# Altium footprint library Component.PcbLib: 115 footprints (part 3 of 8)
Each footprint in its own frame and in the unit in brackets; x right, y up, seen from the top. Pads: shape width x height; smd on the part's side, far side on the other; paste and mask are expansions set on the pad; w line width, h text height; cw(c..) or ccw(c..) is an arc to the next point about the centre after c.
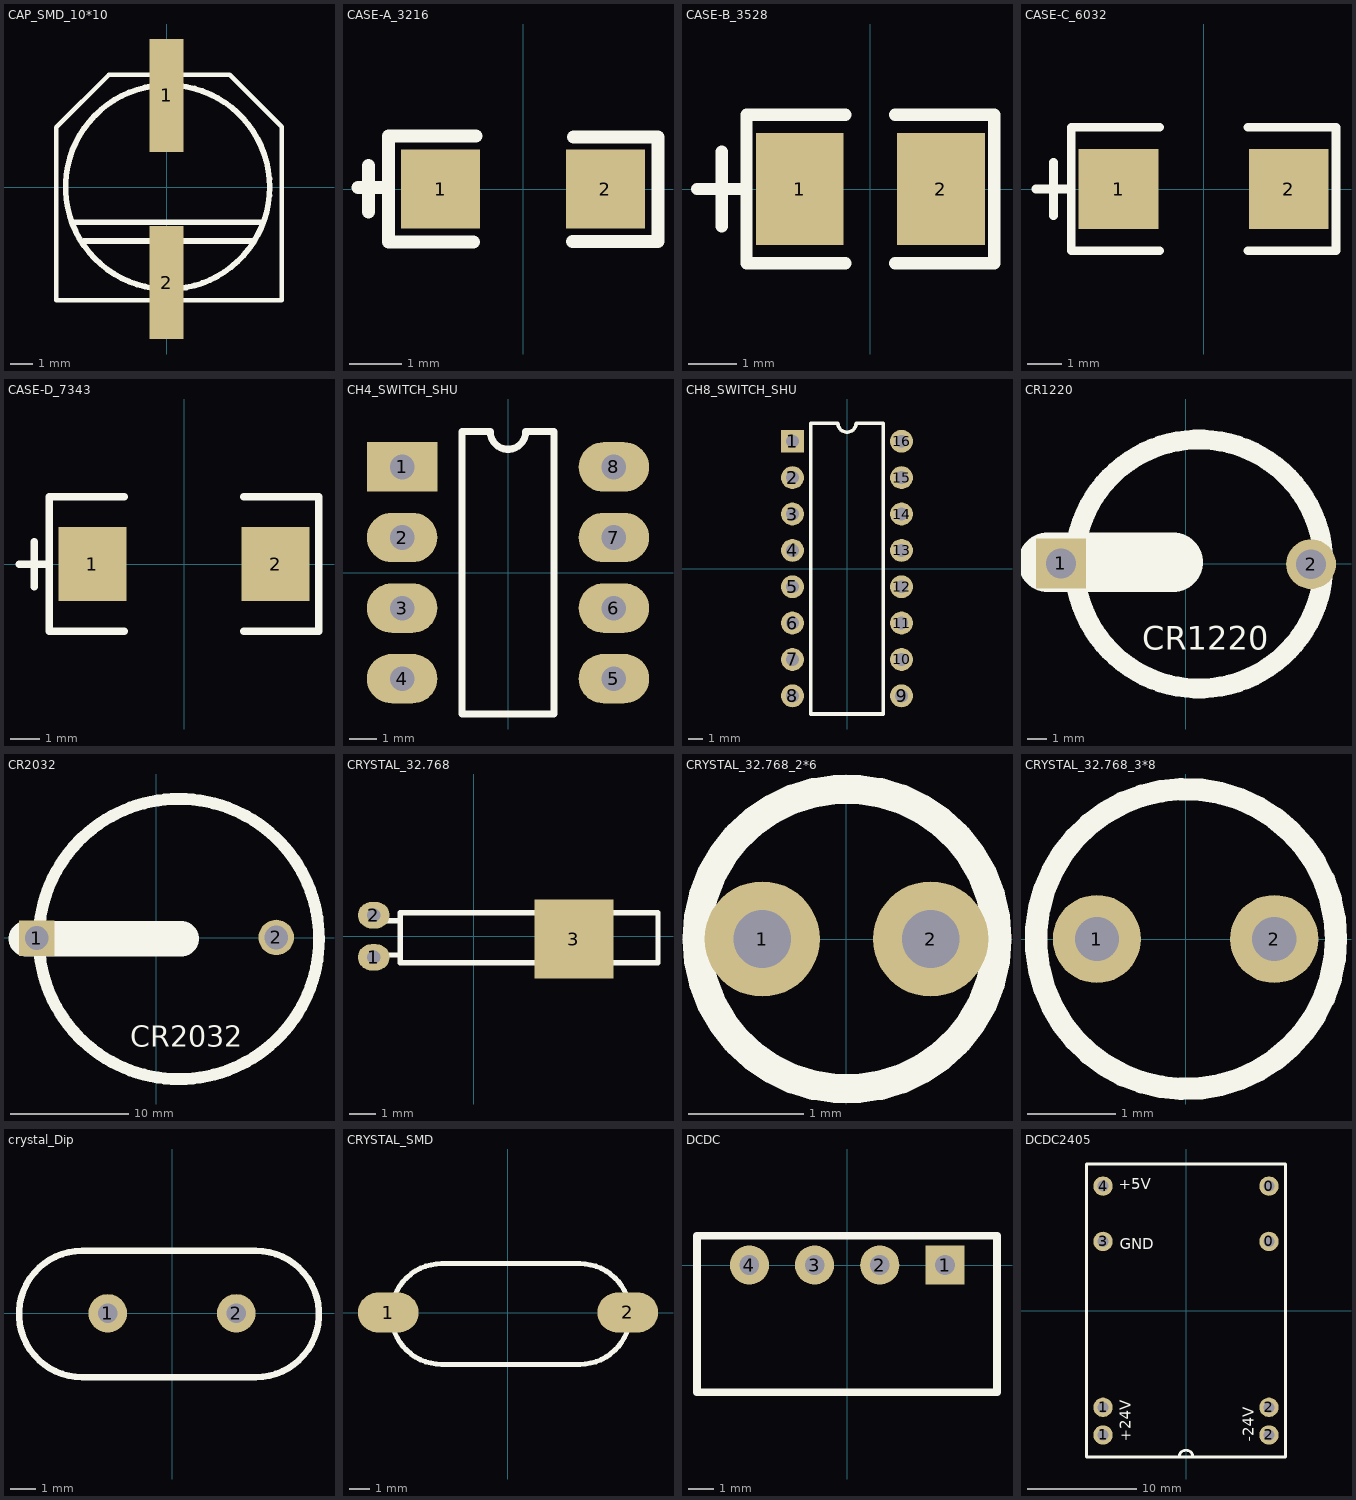
[diagram p2: the footprints below, top view; thin cyan lines are the x and y axes]

## CAP_SMD_10*10 [mm] "贴片电解电容"
pads (2):
  rect 1.5x5 smd: 1(-0.01,4.06) 2(-0.01,-4.23)
Top Overlay:
  circle w0.254: c0.04,0 r4.522
  lines w0.2: -4.89,-5.005 5.09,-5.005 5.09,2.675 2.79,4.975 -2.56,4.975 -4.89,2.645 -4.89,-5.005
  lines w0.254: -4.21,-1.56 4.22,-1.56 ; -3.66,-2.39 3.74,-2.39
3D body: height 10.61, standoff -0.01, extent -5.187,-5.682 5.113,5.618

## CASE-A_3216 [mil]
pads (2):
  rect 60x60 smd: 1(-62.5,0) 2(62.5,0)
Top Overlay:
  lines w9.84: -37.7,-40.16 -101.87,-40.16 -101.87,40.16 -35.73,40.16 ; 37.34,-39.76 102.3,-39.76 102.3,39.37 38.13,39.37
  lines w10: -125.1,1.18 -101.87,1.18 ; -117.22,-17.32 -117.22,17.72
3D body: height 62.99, standoff 0, extent -71.95,-32.29 77.66,30.71

## CASE-B_3528 [mm]
pads (2):
  rect 1.8x2.3 smd: 1(-1.45,0) 2(1.45,0)
Top Overlay:
  lines w0.254: -3.556,0 -2.54,0 ; -3.048,-0.762 -3.048,0.762 ; -0.508,-1.524 -2.54,-1.524 -2.54,1.524 -0.508,1.524 ; 0.508,-1.524 2.54,-1.524 2.54,1.524 0.508,1.524
3D body: height 1.91, standoff 0, extent -1.746,-1.4 1.746,1.4

## CASE-C_6032 [mm]
pads (2):
  rect 2.3x2.3 smd: 1(-2.45,0) 2(2.45,0)
Top Overlay:
  lines w0.254: -4.826,0 -3.81,0 ; -4.318,-0.762 -4.318,0.762 ; -1.27,-1.778 -3.81,-1.778 -3.81,1.778 -1.27,1.778 ; 1.27,-1.778 3.81,-1.778 3.81,1.778 1.27,1.778
3D body: height 2.51, standoff 0, extent -2.997,-1.6 2.997,1.6

## CASE-D_7343 [mm]
pads (2):
  rect 2.3x2.5 smd: 1(-3.1,0) 2(3.1,0)
Top Overlay:
  lines w0.254: -5.588,0 -4.572,0 ; -5.08,-0.762 -5.08,0.762 ; -2.032,-2.286 -4.572,-2.286 -4.572,2.286 -2.032,2.286 ; 2.032,-2.286 4.572,-2.286 4.572,2.286 2.032,2.286
3D body: height 2.81, standoff 0, extent -3.647,-2.15 3.647,2.15

## CH4_SWITCH_SHU [mil]
pads (8):
  rect 100x70 hole 35: 1(-150,150)
  oval 100x70 hole 35: 2(-150,50) 3(-150,-50) 4(-150,-150) 5(150,-150) 6(150,-50) 7(150,50) 8(150,150)
Top Overlay:
  lines w10: -65,-200 -65,200 -25,200 ccw(c0,200) 25,200 65,200 65,-200 -65,-200
3D body: height 448.82, standoff -78.74, extent -275.2,-234.25 220.87,227.16

## CH8_SWITCH_SHU [mm]
height 1.99
pads (16):
  rect 1.6x1.6 hole 0.9: 1(-3.81,8.89)
  round 1.6 hole 0.9: 2(-3.81,6.35) 3(-3.81,3.81) 4(-3.81,1.27) 5(-3.81,-1.27) 6(-3.81,-3.81) 7(-3.81,-6.35) 8(-3.81,-8.89) 9(3.81,-8.89) 10(3.81,-6.35) 11(3.81,-3.81) 12(3.81,-1.27) 13(3.81,1.27) 14(3.81,3.81) 15(3.81,6.35) 16(3.81,8.89)
Top Overlay:
  lines w0.254: -2.54,-10.16 -2.54,10.16 -0.635,10.16 ccw(c0,10.16) 0.635,10.16 2.54,10.16 2.54,-10.16 -2.54,-10.16
3D body: height 11.4, standoff -2, extent -7.31,-10.96 5.29,10.92

## CR1220 [mm] "pin 12mm"
height 2
pads (2):
  rect 2.5x2.5 hole 1.5: 1(-6.285,0.02)
  round 2.5 hole 1.5: 2(6.285,-0.02)
Top Overlay:
  circle w1: c0.654,-0.01 r6.25
  lines w3: -6.955,0.08 -0.635,0.08
  text "CR1220" at -2.205,-4.73 h2
3D body: height 4.2, standoff -3.7, extent -6.445,-6.09 7.255,6.41

## CR2032 [mm] "pin 20mm"
height 3.2
pads (2):
  rect 3x3 hole 2: 1(-10.14,-0.025)
  round 3 hole 2: 2(10.14,0.025)
Top Overlay:
  circle w1: c1.899,-0.105 r11.861
  lines w3: -11.04,-0.075 2.11,-0.075
  text "CR2032" at -2.21,-9.825 h3
3D body: height 4.64, standoff -4.6, extent -13.354,-14.363 15.094,14.085

## CRYSTAL_32.768 [mm]
height 1.99
pads (3):
  oval 1.2x1 hole 0.5: 1(-3.805,-0.8) 2(-3.805,0.8)
  rect 3x3 smd: 3(3.805,-0.109)
Top Overlay:
  lines w0.2: -3.495,-0.709 -2.795,-0.709 ; -3.395,0.591 -2.795,0.591 ; -2.595,-1.009 7.005,-1.009 7.005,0.891 -2.795,0.891 -2.795,-1.009 -2.495,-1.009
3D body: height 1.55, standoff -1.55, extent -4.46,-1.629 6.69,1.471

## CRYSTAL_32.768_2*6 [mm] "φ:2mm  height:6mm"
height 6
pads (2):
  round 1 hole 0.5: 1(-0.73,0) 2(0.73,0)
Top Overlay:
  circle w0.254: c0.005,0 r1.3

## CRYSTAL_32.768_3*8 [mm] "φ:3mm  height:8mm"
height 8
pads (2):
  round 1 hole 0.5: 1(-1.005,0) 2(1.005,0)
Top Overlay:
  circle w0.254: c0.005,0 r1.7
3D body: height 8.2, standoff -2.95, extent -1.55,-1.55 1.55,1.55

## crystal_Dip [mil]
pads (2):
  round 60 hole 30: 1(-100,0) 2(100,0)
Top Overlay:
  lines w10: -139.69,-99.39 cw(c-139.69,-0.97) -139.69,97.46 130.31,97.46 cw(c130.31,-0.97) 130.31,-99.39 -139.69,-99.39
3D body: height 144.88, standoff -72.83, extent -223.62,-92.13 216.54,92.91

## CRYSTAL_SMD [mm]
height 1.99
pads (2):
  oval 3x2 smd: 1(-5.945,-0.002) 2(5.945,0.002)
Top Overlay:
  lines w0.254: -3.293,-2.572 cw(c-3.293,-0.072) -3.293,2.428 3.565,2.428 cw(c3.565,-0.072) 3.565,-2.572 -3.293,-2.572
3D body: height 4.3, standoff 0, extent -6.305,-2.378 6.495,2.452

## DCDC [mil] "MORNSUN 隔离电源"
pads (4):
  rect 60x60 hole 30: 1(150,0)
  round 60 hole 30: 2(50,0) 3(-50,0) 4(-150,0)
Top Overlay:
  lines w12: -230.31,-195.12 229.69,-195.12 229.69,44.88 -230.31,44.88 -230.31,-195.12
3D body: height 78.74, standoff -39.37, extent 130.48,-19.64 169.69,19.65
3D body: height 78.74, standoff -39.37, extent 30.48,-19.64 69.69,19.65
3D body: height 78.74, standoff -39.37, extent -69.52,-19.64 -30.31,19.65
3D body: height 78.74, standoff -39.37, extent -169.53,-19.64 -130.31,19.65
3D body: height 472.44, standoff 78.74, extent -224.8,-192.91 224.02,43.31

## DCDC2405 [mil]
height 78.35
pads (8):
  round 70 hole 40: 0(300,250) 0(300,450) 1(-300,-450) 1(-300,-350) 2(300,-450) 2(300,-350) 3(-300,250) 4(-300,450)
Top Overlay:
  lines w10: -25,-530 cw(c0,-530) 25,-530 ; -360,-530 -360,530 360,530 360,-530 -360,-530
  text "+5V" at -242.96,438.78 h40
  text "GND" at -239.02,222.24 h40
  text "-24V" at 245.23,-474.61 h40
  text "+24V" at -199.65,-474.61 h40
3D body: height 374.02, standoff -98.43, extent -394.61,-625.98 404.61,625.99